# Altium footprint library Power_Lib_Altium.PcbLib: 383 footprints (part 8 of 24)
Each footprint in its own frame and in the unit in brackets; x right, y up, seen from the top. Pads: shape width x height; smd on the part's side, far side on the other; paste and mask are expansions set on the pad; w line width, h text height; cw(c..) or ccw(c..) is an arc to the next point about the centre after c.
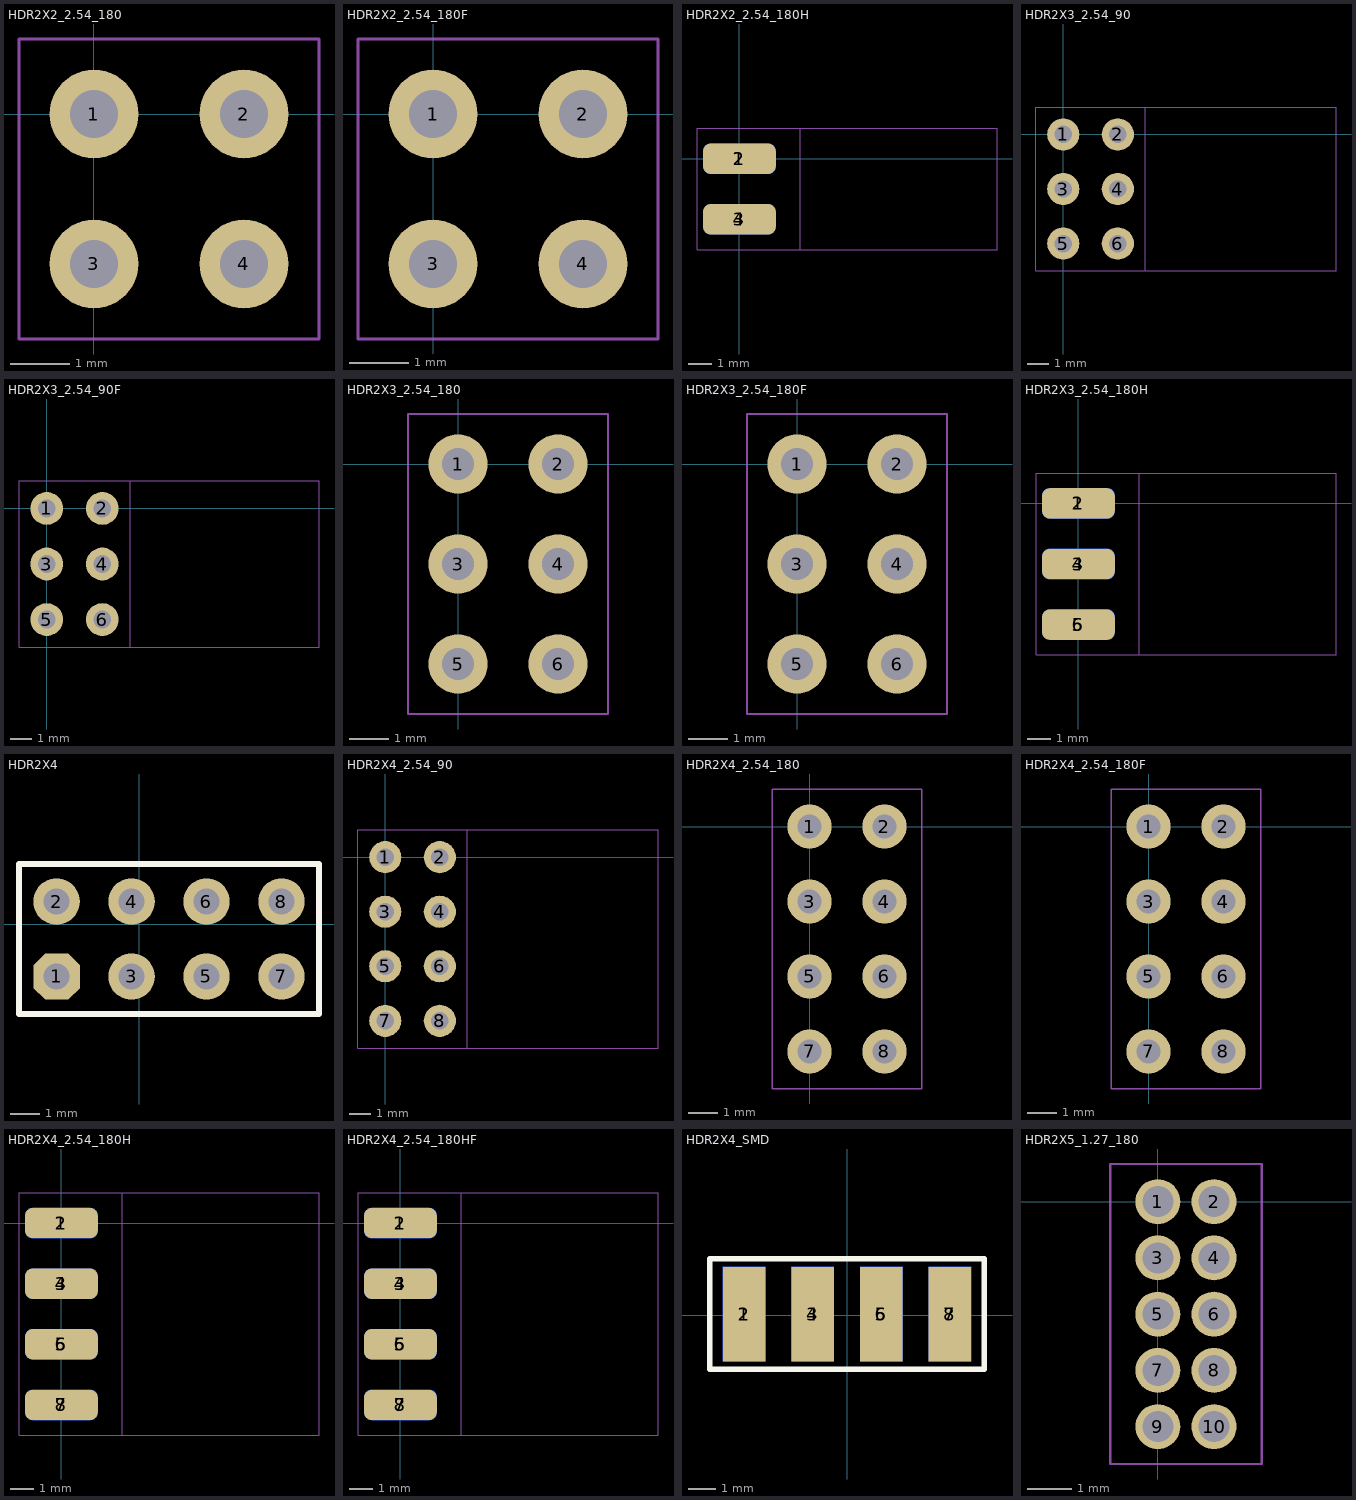
[diagram p7: the footprints below, top view; thin cyan lines are the x and y axes]

## HDR2X2_2.54_180 [mm]
height 4.3
pads (4):
  round 1.5 hole 0.813: 1(0,0) 2(2.54,0) 3(0,-2.54) 4(2.54,-2.54)
Mechanical 13:
  lines w0.051: -1.27,-3.81 -1.27,1.27 3.81,1.27 3.81,-3.81 -1.27,-3.81
Mechanical 14:
  lines w0.051: -1.27,-3.81 3.81,-3.81 3.81,1.27 -1.27,1.27 -1.27,-3.81
3D body "pin_header_awl254-dg-g04d.stp": height 8.5, standoff -3, extent -1.27,-3.81 3.81,1.27

## HDR2X2_2.54_180F [mm]
height 4.3
pads (4):
  round 1.5 hole 0.813: 1(0,0) 2(2.54,0) 3(0,-2.54) 4(2.54,-2.54)
Mechanical 13:
  lines w0.051: -1.27,-3.81 3.81,-3.81 3.81,1.27 -1.27,1.27 -1.27,-3.81
Mechanical 14:
  lines w0.051: -1.27,-3.81 -1.27,1.27 3.81,1.27 3.81,-3.81 -1.27,-3.81
3D body "female_header_a-bl254-dg-g04d.stp": height 8.5, standoff -3.2, extent -1.23,-3.935 3.77,1.395

## HDR2X2_2.54_180H [mil]
height 169.29
pads (4):
  rrect50% 120x50 smd: 1(0,0) 3(0,-100)
  rrect50% 120x50 smd far side: 2(0,0) 4(0,-100)
Mechanical 13:
  lines w2: -70,-150 -70,50 425,50 425,-150 -70,-150
Mechanical 14:
  lines w2: -70,-150 -70,50 100,50 100,-150 -70,-150
Mechanical 15:
  lines w2: -70,-150 -70,50 100,50 100,-150 -70,-150
3D body "pin_header_awl254-dg-g04d.stp": height 78, standoff -122, extent -38.11,-149.99 414.65,50.01

## HDR2X3_2.54_90 [mm]
height 4.3
pads (6):
  round 1.5 hole 0.813: 1(0,0) 2(2.54,0) 3(0,-2.54) 4(2.54,-2.54) 5(0,-5.08) 6(2.54,-5.08)
Mechanical 13:
  lines w0.051: -1.27,-6.35 12.7,-6.35 12.7,1.27 -1.27,1.27 -1.27,-6.35
Mechanical 14:
  lines w0.051: -1.27,-6.35 -1.27,1.27 3.81,1.27 3.81,-6.35 -1.27,-6.35
3D body "pin_header_awl254-da-g06d.stp": height 5.04, standoff -2.96, extent -0.254,-6.35 12.626,1.27

## HDR2X3_2.54_90F [mm]
height 4.3
pads (6):
  round 1.5 hole 0.813: 1(0,0) 2(2.54,0) 3(0,-2.54) 4(2.54,-2.54) 5(0,-5.08) 6(2.54,-5.08)
Mechanical 13:
  lines w0.051: -1.27,-6.35 -1.27,1.27 12.446,1.27 12.446,-6.35 -1.27,-6.35
Mechanical 14:
  lines w0.051: -1.27,-6.35 -1.27,1.27 3.81,1.27 3.81,-6.35 -1.27,-6.35
3D body "female_header_a-bl254-da-g06d.stp": height 5.04, standoff -3.16, extent -0.254,-6.475 12.346,1.395

## HDR2X3_2.54_180 [mm]
height 4.3
pads (6):
  round 1.5 hole 0.813: 1(0,0) 2(2.54,0) 3(0,-2.54) 4(2.54,-2.54) 5(0,-5.08) 6(2.54,-5.08)
Mechanical 13:
  lines w0.051: -1.27,-6.35 3.81,-6.35 3.81,1.27 -1.27,1.27 -1.27,-6.35
Mechanical 14:
  lines w0.051: -1.27,-6.35 3.81,-6.35 3.81,1.27 -1.27,1.27 -1.27,-6.35
3D body "pin_header_awl254-dg-g06d.stp": height 8.5, standoff -3, extent -1.27,-6.35 3.81,1.27

## HDR2X3_2.54_180F [mm]
height 4.3
pads (6):
  round 1.5 hole 0.813: 1(0,0) 2(2.54,0) 3(0,-2.54) 4(2.54,-2.54) 5(0,-5.08) 6(2.54,-5.08)
Mechanical 13:
  lines w0.051: -1.27,-6.35 -1.27,1.27 3.81,1.27 3.81,-6.35 -1.27,-6.35
Mechanical 14:
  lines w0.051: -1.27,-6.35 -1.27,1.27 3.81,1.27 3.81,-6.35 -1.27,-6.35
3D body "female_header_a-bl254-dg-g06d.stp": height 8.5, standoff -3.2, extent -1.23,-6.475 3.77,1.395

## HDR2X3_2.54_180H [mil]
height 169.29
pads (6):
  rrect50% 120x50 smd: 1(0,0) 3(0,-100) 5(0,-200)
  rrect50% 120x50 smd far side: 2(0,0) 4(0,-100) 6(0,-200)
Mechanical 13:
  lines w2: -70,-250 425,-250 425,50 -70,50 -70,-250
Mechanical 14:
  lines w2: -70,-250 100,-250 100,50 -70,50 -70,-250
Mechanical 15:
  lines w2: -70,-250 100,-250 100,50 -70,50 -70,-250
3D body "pin_header_awl254-dg-g06d.stp": height 78, standoff -122, extent -38.11,-249.99 414.65,50.01

## HDR2X4 [mil]
pads (8):
  oct 62x62 hole 35: 1(-110,-70)
  round 62 hole 35: 2(-110,30) 3(-10,-70) 4(-10,30) 5(90,-70) 6(90,30) 7(190,-70) 8(190,30)
Top Overlay:
  lines w8: -160,-120 240,-120 240,80 -160,80 -160,-120
3D body "User Library-1x2 TH Pitch 2_54mm.SLDPRT": height 373.85, standoff -125.98, extent -160,-120 -60,80
3D body "User Library-1x2 TH Pitch 2_54mm.SLDPRT": height 373.85, standoff -125.98, extent -60,-120 40,80
3D body "User Library-1x2 TH Pitch 2_54mm.SLDPRT": height 373.85, standoff -125.98, extent 40,-120 140,80
3D body "User Library-1x2 TH Pitch 2_54mm.SLDPRT": height 373.85, standoff -125.98, extent 140,-120 240,80

## HDR2X4_2.54_90 [mm]
height 4.3
pads (8):
  round 1.5 hole 0.813: 1(0,0) 2(2.54,0) 3(0,-2.54) 4(2.54,-2.54) 5(0,-5.08) 6(2.54,-5.08) 7(0,-7.62) 8(2.54,-7.62)
Mechanical 13:
  lines w0.051: -1.27,-8.89 12.7,-8.89 12.7,1.27 -1.27,1.27 -1.27,-8.89
Mechanical 14:
  lines w0.051: -1.27,-8.89 3.81,-8.89 3.81,1.27 -1.27,1.27 -1.27,-8.89
3D body "pin_header_awl254-da-g08d.stp": height 5.04, standoff -2.96, extent -0.316,-8.89 12.564,1.27

## HDR2X4_2.54_180 [mm]
height 4.3
pads (8):
  round 1.5 hole 0.813: 1(0,0) 2(2.54,0) 3(0,-2.54) 4(2.54,-2.54) 5(0,-5.08) 6(2.54,-5.08) 7(0,-7.62) 8(2.54,-7.62)
Mechanical 13:
  lines w0.051: -1.27,-8.89 -1.27,1.27 3.81,1.27 3.81,-8.89 -1.27,-8.89
Mechanical 14:
  lines w0.051: -1.27,-8.89 -1.27,1.27 3.81,1.27 3.81,-8.89 -1.27,-8.89
3D body "pin_header_awl254-dg-g08d.stp": height 8.5, standoff -3, extent -1.27,-8.89 3.81,1.27

## HDR2X4_2.54_180F [mm]
height 4.3
pads (8):
  round 1.5 hole 0.813: 1(0,0) 2(2.54,0) 3(0,-2.54) 4(2.54,-2.54) 5(0,-5.08) 6(2.54,-5.08) 7(0,-7.62) 8(2.54,-7.62)
Mechanical 13:
  lines w0.051: -1.27,-8.89 -1.27,1.27 3.81,1.27 3.81,-8.89 -1.27,-8.89
Mechanical 14:
  lines w0.051: -1.27,-8.89 -1.27,1.27 3.81,1.27 3.81,-8.89 -1.27,-8.89
3D body "female_header_a-bl254-dg-g08d.stp": height 8.5, standoff -3.2, extent -1.23,-9.015 3.77,1.395

## HDR2X4_2.54_180H [mil]
height 169.29
pads (8):
  rrect50% 120x50 smd: 1(0,0) 3(0,-100) 5(0,-200) 7(0,-300)
  rrect50% 120x50 smd far side: 2(0,0) 4(0,-100) 6(0,-200) 8(0,-300)
Mechanical 13:
  lines w2: -70,-350 425,-350 425,50 -70,50 -70,-350
Mechanical 14:
  lines w2: -70,-350 100,-350 100,50 -70,50 -70,-350
Mechanical 15:
  lines w2: -70,-350 100,-350 100,50 -70,50 -70,-350
3D body "pin_header_awl254-dg-g08d.stp": height 78, standoff -122, extent -38.11,-350 414.64,50

## HDR2X4_2.54_180HF [mil]
height 169.29
pads (8):
  rrect50% 120x50 smd: 1(0,0) 3(0,-100) 5(0,-200) 7(0,-300)
  rrect50% 120x50 smd far side: 2(0,0) 4(0,-100) 6(0,-200) 8(0,-300)
Mechanical 13:
  lines w2: -70,-350 -70,50 425,50 425,-350 -70,-350
Mechanical 14:
  lines w2: -70,-350 -70,50 100,50 100,-350 -70,-350
Mechanical 15:
  lines w2: -70,-350 -70,50 100,50 100,-350 -70,-350
3D body "female_header_a-bl254-dg-g08d.stp": height 76.43, standoff -120.43, extent -35.98,-354.92 424.65,54.92

## HDR2X4_SMD [mm]
pads (8):
  rect 1.575x3.5 smd: 1(-3.819,0.047) 3(-1.279,0.047) 5(1.261,0.047) 7(3.801,0.047)
  rect 1.575x3.5 smd far side: 2(-3.819,0.047) 4(-1.279,0.047) 6(1.261,0.047) 8(3.801,0.047)
Top Overlay:
  lines w0.203: -5.089,-2 5.071,-2 5.071,2.1 -5.089,2.1 -5.089,-2
3D body "User Library-1x2 TH Pitch 2_54mm.SLDPRT": height 1.57, standoff -3.51, extent -5.095,-11.221 -2.555,1.475
3D body "User Library-1x2 TH Pitch 2_54mm.SLDPRT": height 1.57, standoff -3.51, extent -2.55,-11.221 -0.01,1.475
3D body "User Library-1x2 TH Pitch 2_54mm.SLDPRT": height 1.57, standoff -3.51, extent 0.005,-11.221 2.545,1.475
3D body "User Library-1x2 TH Pitch 2_54mm.SLDPRT": height 1.57, standoff -3.51, extent 2.55,-11.221 5.09,1.475

## HDR2X5_1.27_180 [mil]
height 169.29
pads (10):
  round 40 hole 27.56: 1(0,0) 2(50,0) 3(0,-50) 4(50,-50) 5(0,-100) 6(50,-100) 7(0,-150) 8(50,-150) 9(0,-200) 10(50,-200)
Mechanical 13:
  lines w2: -42.32,-233.27 -42.32,33.46 92.52,33.46 92.52,-233.27 -42.32,-233.27
Mechanical 14:
  lines w2: -42.32,-233.27 -42.32,33.46 92.52,33.46 92.52,-233.27 -42.32,-233.27